# Altium footprint library MCP23S17.PcbLib: 1 footprints
Each footprint in its own frame and in the unit in brackets; x right, y up, seen from the top. Pads: shape width x height; smd on the part's side, far side on the other; paste and mask are expansions set on the pad; w line width, h text height; cw(c..) or ccw(c..) is an arc to the next point about the centre after c.
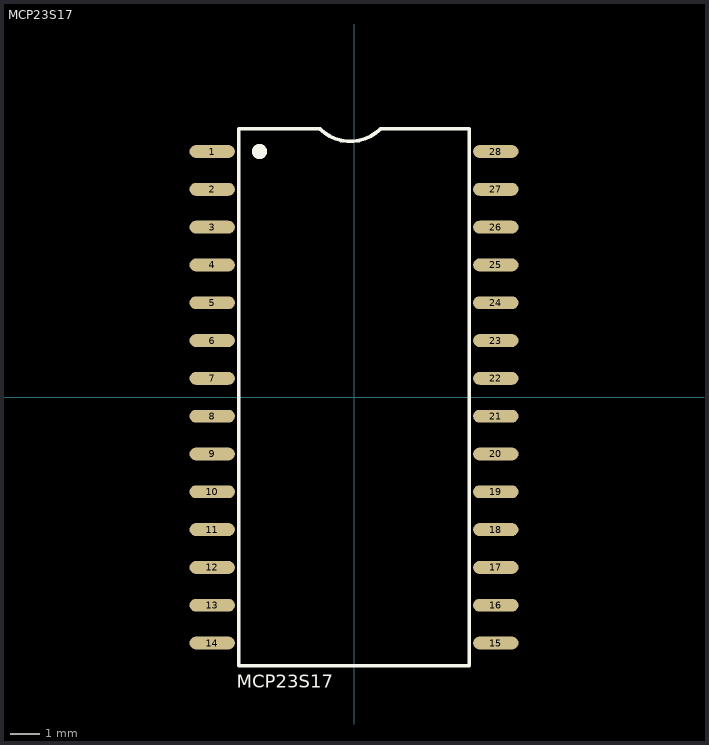
[diagram p0: the footprint, top view; thin cyan lines are the x and y axes]

## MCP23S17 [mil] "扩展模块"
pads (28):
  oval 60x17 smd: 1(-187.5,325) 2(-187.5,275) 3(-187.5,225) 4(-187.5,175) 5(-187.5,125) 6(-187.5,75) 7(-187.5,25) 8(-187.5,-25) 9(-187.5,-75) 10(-187.5,-125) 11(-187.5,-175) 12(-187.5,-225) 13(-187.5,-275) 14(-187.5,-325) 15(187.5,-325) 16(187.5,-275) 17(187.5,-225) 18(187.5,-175) 19(187.5,-125) 20(187.5,-75) 21(187.5,-25) 22(187.5,25) 23(187.5,75) 24(187.5,125) 25(187.5,175) 26(187.5,225) 27(187.5,275) 28(187.5,325)
Top Overlay:
  circle w10: c-125,325 r5
  lines w5: -152.5,355 -152.5,-355 152.5,-355 152.5,355 ; -150,355 -85,355 -45,355 ccw(c-5,395) 35,355 90,355 150,355
  text "MCP23S17" at -155,-390 h30